# Altium schematic symbol library jlcpcb_2025_04_capacitors_extended_0805.schlib: 3281 symbols (part 18 of 18) (continued)
## TCC0805X7R475K100FT
designator C?  Capacitance: 4.7uF  (hidden comment: *)
Capacitor, Ceramic (MLCC), 4.7uF, ±10%, 10V, X7R, ±10%, SMD 0805; Manufacturer: CCTC; Manufacturer Part Number: TCC0805X7R475K100FT; Package Size: 0805; JLCPCB Basic Part: No; JLCPCB Part Number: C380350; Supplier 1: LCSC; Category: Capacitors - MLCC; Supplier Part Number 1: C380350; Tolerance: ±10%; Voltage Rating: 10V; Temperature Coefficient: X7R; RoHS: Yes; ComponentLink1Description: Datasheet; ComponentLink1URL: https://wmsc.lcsc.com/wmsc/upload/file/pdf/v2/lcsc/2304140030_CCTC-TCC0805X7R475K100FT_C380350.pdf; ComponentLink2Description: JLCPCB Part URL; ComponentLink2URL: https://jlcpcb.com/partdetail/C380350; ComponentLink3Description: LCSC Part URL; ComponentLink3URL: https://lcsc.com/product-detail/Multilayer-Ceramic-Capacitors-MLCC---SMD-SMT_CCTC-CCTC-TCC0805X7R475K100FT_C380350.html
footprint CAP-0805 (0805 (2012M) Capacitor)
pins: 1, 2

## TCC0805X7R475K250FT
designator C?  Capacitance: 4.7uF  (hidden comment: *)
Capacitor, Ceramic (MLCC), 4.7uF, ±10%, 25V, X7R, ±10%, SMD 0805; Manufacturer: CCTC; Manufacturer Part Number: TCC0805X7R475K250FT; Package Size: 0805; JLCPCB Basic Part: No; JLCPCB Part Number: C380351; Supplier 1: LCSC; Category: Capacitors - MLCC; Supplier Part Number 1: C380351; Tolerance: ±10%; Voltage Rating: 25V; Temperature Coefficient: X7R; RoHS: Yes; ComponentLink1Description: Datasheet; ComponentLink1URL: https://wmsc.lcsc.com/wmsc/upload/file/pdf/v2/lcsc/2304140030_CCTC-TCC0805X7R475K250FT_C380351.pdf; ComponentLink2Description: JLCPCB Part URL; ComponentLink2URL: https://jlcpcb.com/partdetail/C380351; ComponentLink3Description: LCSC Part URL; ComponentLink3URL: https://lcsc.com/product-detail/Multilayer-Ceramic-Capacitors-MLCC---SMD-SMT_CCTC-CCTC-TCC0805X7R475K250FT_C380351.html
footprint CAP-0805 (0805 (2012M) Capacitor)
pins: 1, 2

## TCC0805X7R502K500DT
designator C?  Capacitance: 5nF  (hidden comment: *)
Capacitor, Ceramic (MLCC), 5nF, ±10%, 50V, X7R, ±10%, SMD 0805; Manufacturer: CCTC; Manufacturer Part Number: TCC0805X7R502K500DT; Package Size: 0805; JLCPCB Basic Part: No; JLCPCB Part Number: C376995; Supplier 1: LCSC; Category: Capacitors - MLCC; Supplier Part Number 1: C376995; Tolerance: ±10%; Voltage Rating: 50V; Temperature Coefficient: X7R; RoHS: Yes; ComponentLink1Description: Datasheet; ComponentLink1URL: https://wmsc.lcsc.com/wmsc/upload/file/pdf/v2/lcsc/2304140030_CCTC-TCC0805X7R502K500DT_C376995.pdf; ComponentLink2Description: JLCPCB Part URL; ComponentLink2URL: https://jlcpcb.com/partdetail/C376995; ComponentLink3Description: LCSC Part URL; ComponentLink3URL: https://lcsc.com/product-detail/Multilayer-Ceramic-Capacitors-MLCC---SMD-SMT_CCTC-CCTC-TCC0805X7R502K500DT_C376995.html
footprint CAP-0805 (0805 (2012M) Capacitor)
pins: 1, 2

## TCC0805X7R561K500BT
designator C?  Capacitance: 560pF  (hidden comment: *)
Capacitor, Ceramic (MLCC), 560pF, ±10%, 50V, X7R, ±10%, SMD 0805; Manufacturer: CCTC; Manufacturer Part Number: TCC0805X7R561K500BT; Package Size: 0805; JLCPCB Basic Part: No; JLCPCB Part Number: C282771; Supplier 1: LCSC; Category: Capacitors - MLCC; Supplier Part Number 1: C282771; Tolerance: ±10%; Voltage Rating: 50V; Temperature Coefficient: X7R; RoHS: Yes; ComponentLink1Description: Datasheet; ComponentLink1URL: https://wmsc.lcsc.com/wmsc/upload/file/pdf/v2/lcsc/2304140030_CCTC-TCC0805X7R561K500BT_C282771.pdf; ComponentLink2Description: JLCPCB Part URL; ComponentLink2URL: https://jlcpcb.com/partdetail/C282771; ComponentLink3Description: LCSC Part URL; ComponentLink3URL: https://lcsc.com/product-detail/Multilayer-Ceramic-Capacitors-MLCC---SMD-SMT_CCTC-CCTC-TCC0805X7R561K500BT_C282771.html
footprint CAP-0805 (0805 (2012M) Capacitor)
pins: 1, 2

## TCC0805X7R561K500DTS
designator C?  Capacitance: 560pF  (hidden comment: *)
Capacitor, Ceramic (MLCC), 560pF, ±10%, 50V, X7R, ±10%, SMD 0805; Manufacturer: CCTC; Manufacturer Part Number: TCC0805X7R561K500DTS; Package Size: 0805; JLCPCB Basic Part: No; JLCPCB Part Number: C376999; Supplier 1: LCSC; Category: Capacitors - MLCC; Supplier Part Number 1: C376999; Tolerance: ±10%; Voltage Rating: 50V; Temperature Coefficient: X7R; RoHS: Yes; ComponentLink1Description: Datasheet; ComponentLink1URL: https://wmsc.lcsc.com/wmsc/upload/file/pdf/v2/lcsc/2304140030_CCTC-TCC0805X7R561K500DTS_C376999.pdf; ComponentLink2Description: JLCPCB Part URL; ComponentLink2URL: https://jlcpcb.com/partdetail/C376999; ComponentLink3Description: LCSC Part URL; ComponentLink3URL: https://lcsc.com/product-detail/Multilayer-Ceramic-Capacitors-MLCC---SMD-SMT_CCTC-CCTC-TCC0805X7R561K500DTS_C376999.html
footprint CAP-0805 (0805 (2012M) Capacitor)
pins: 1, 2

## TCC0805X7R562K500DT
designator C?  Capacitance: 5.6nF  (hidden comment: *)
Capacitor, Ceramic (MLCC), 5.6nF, ±10%, 50V, X7R, ±10%, SMD 0805; Manufacturer: CCTC; Manufacturer Part Number: TCC0805X7R562K500DT; Package Size: 0805; JLCPCB Basic Part: No; JLCPCB Part Number: C282772; Supplier 1: LCSC; Category: Capacitors - MLCC; Supplier Part Number 1: C282772; Tolerance: ±10%; Voltage Rating: 50V; Temperature Coefficient: X7R; RoHS: Yes; ComponentLink1Description: Datasheet; ComponentLink1URL: https://wmsc.lcsc.com/wmsc/upload/file/pdf/v2/lcsc/2304140030_CCTC-TCC0805X7R562K500DT_C282772.pdf; ComponentLink2Description: JLCPCB Part URL; ComponentLink2URL: https://jlcpcb.com/partdetail/C282772; ComponentLink3Description: LCSC Part URL; ComponentLink3URL: https://lcsc.com/product-detail/Multilayer-Ceramic-Capacitors-MLCC---SMD-SMT_CCTC-CCTC-TCC0805X7R562K500DT_C282772.html
footprint CAP-0805 (0805 (2012M) Capacitor)
pins: 1, 2

## TCC0805X7R563K500DT
designator C?  Capacitance: 56nF  (hidden comment: *)
Capacitor, Ceramic (MLCC), 56nF, ±10%, 50V, X7R, ±10%, SMD 0805; Manufacturer: CCTC; Manufacturer Part Number: TCC0805X7R563K500DT; Package Size: 0805; JLCPCB Basic Part: No; JLCPCB Part Number: C282773; Supplier 1: LCSC; Category: Capacitors - MLCC; Supplier Part Number 1: C282773; Tolerance: ±10%; Voltage Rating: 50V; Temperature Coefficient: X7R; RoHS: Yes; ComponentLink1Description: Datasheet; ComponentLink1URL: https://wmsc.lcsc.com/wmsc/upload/file/pdf/v2/lcsc/2304140030_CCTC-TCC0805X7R563K500DT_C282773.pdf; ComponentLink2Description: JLCPCB Part URL; ComponentLink2URL: https://jlcpcb.com/partdetail/C282773; ComponentLink3Description: LCSC Part URL; ComponentLink3URL: https://lcsc.com/product-detail/Multilayer-Ceramic-Capacitors-MLCC---SMD-SMT_CCTC-CCTC-TCC0805X7R563K500DT_C282773.html
footprint CAP-0805 (0805 (2012M) Capacitor)
pins: 1, 2

## TCC0805X7R564K500DT
designator C?  Capacitance: 560nF  (hidden comment: *)
Capacitor, Ceramic (MLCC), 560nF, ±10%, 50V, X7R, ±10%, SMD 0805; Manufacturer: CCTC; Manufacturer Part Number: TCC0805X7R564K500DT; Package Size: 0805; JLCPCB Basic Part: No; JLCPCB Part Number: C377000; Supplier 1: LCSC; Category: Capacitors - MLCC; Supplier Part Number 1: C377000; Tolerance: ±10%; Voltage Rating: 50V; Temperature Coefficient: X7R; RoHS: Yes; ComponentLink1Description: Datasheet; ComponentLink1URL: https://wmsc.lcsc.com/wmsc/upload/file/pdf/v2/lcsc/2304140030_CCTC-TCC0805X7R564K500DT_C377000.pdf; ComponentLink2Description: JLCPCB Part URL; ComponentLink2URL: https://jlcpcb.com/partdetail/C377000; ComponentLink3Description: LCSC Part URL; ComponentLink3URL: https://lcsc.com/product-detail/Multilayer-Ceramic-Capacitors-MLCC---SMD-SMT_CCTC-CCTC-TCC0805X7R564K500DT_C377000.html
footprint CAP-0805 (0805 (2012M) Capacitor)
pins: 1, 2

## TCC0805X7R564M500DT
designator C?  Capacitance: 560000pF  (hidden comment: *)
Capacitor, Ceramic (MLCC), 560000pF, ±20%, null, X7R, ±20%, SMD 0805; Manufacturer: CCTC; Manufacturer Part Number: TCC0805X7R564M500DT; Package Size: 0805; JLCPCB Basic Part: No; JLCPCB Part Number: C7393963; Supplier 1: LCSC; Category: Capacitors - MLCC; Supplier Part Number 1: C7393963; Tolerance: ±20%; Voltage Rating: null; Temperature Coefficient: X7R; RoHS: Yes; ComponentLink1Description: Datasheet; ComponentLink1URL: https://wmsc.lcsc.com/wmsc/upload/file/pdf/v2/lcsc/2306211555_CCTC-TCC0805X7R564M500DT_C7393963.pdf; ComponentLink2Description: JLCPCB Part URL; ComponentLink2URL: https://jlcpcb.com/partdetail/C7393963; ComponentLink3Description: LCSC Part URL; ComponentLink3URL: https://lcsc.com/product-detail/Multilayer-Ceramic-Capacitors-MLCC---SMD-SMT_CCTC-CCTC-TCC0805X7R564M500DT_C7393963.html
footprint CAP-0805 (0805 (2012M) Capacitor)
pins: 1, 2

## TCC0805X7R681K101DT
designator C?  Capacitance: 680pF  (hidden comment: *)
Capacitor, Ceramic (MLCC), 680pF, ±10%, 100V, X7R, ±10%, SMD 0805; Manufacturer: CCTC; Manufacturer Part Number: TCC0805X7R681K101DT; Package Size: 0805; JLCPCB Basic Part: No; JLCPCB Part Number: C282774; Supplier 1: LCSC; Category: Capacitors - MLCC; Supplier Part Number 1: C282774; Tolerance: ±10%; Voltage Rating: 100V; Temperature Coefficient: X7R; RoHS: Yes; ComponentLink1Description: Datasheet; ComponentLink1URL: https://wmsc.lcsc.com/wmsc/upload/file/pdf/v2/lcsc/2304140030_CCTC-TCC0805X7R681K101DT_C282774.pdf; ComponentLink2Description: JLCPCB Part URL; ComponentLink2URL: https://jlcpcb.com/partdetail/C282774; ComponentLink3Description: LCSC Part URL; ComponentLink3URL: https://lcsc.com/product-detail/Multilayer-Ceramic-Capacitors-MLCC---SMD-SMT_CCTC-CCTC-TCC0805X7R681K101DT_C282774.html
footprint CAP-0805 (0805 (2012M) Capacitor)
pins: 1, 2

## TCC0805X7R681K251DT
designator C?  Capacitance: 680pF  (hidden comment: *)
Capacitor, Ceramic (MLCC), 680pF, ±10%, 250V, X7R, ±10%, SMD 0805; Manufacturer: CCTC; Manufacturer Part Number: TCC0805X7R681K251DT; Package Size: 0805; JLCPCB Basic Part: No; JLCPCB Part Number: C377002; Supplier 1: LCSC; Category: Capacitors - MLCC; Supplier Part Number 1: C377002; Tolerance: ±10%; Voltage Rating: 250V; Temperature Coefficient: X7R; RoHS: Yes; ComponentLink1Description: Datasheet; ComponentLink1URL: https://wmsc.lcsc.com/wmsc/upload/file/pdf/v2/lcsc/2304140030_CCTC-TCC0805X7R681K251DT_C377002.pdf; ComponentLink2Description: JLCPCB Part URL; ComponentLink2URL: https://jlcpcb.com/partdetail/C377002; ComponentLink3Description: LCSC Part URL; ComponentLink3URL: https://lcsc.com/product-detail/Multilayer-Ceramic-Capacitors-MLCC---SMD-SMT_CCTC-CCTC-TCC0805X7R681K251DT_C377002.html
footprint CAP-0805 (0805 (2012M) Capacitor)
pins: 1, 2

## TCC0805X7R681K500DT
designator C?  Capacitance: 680pF  (hidden comment: *)
Capacitor, Ceramic (MLCC), 680pF, ±10%, 50V, X7R, ±10%, SMD 0805; Manufacturer: CCTC; Manufacturer Part Number: TCC0805X7R681K500DT; Package Size: 0805; JLCPCB Basic Part: No; JLCPCB Part Number: C282775; Supplier 1: LCSC; Category: Capacitors - MLCC; Supplier Part Number 1: C282775; Tolerance: ±10%; Voltage Rating: 50V; Temperature Coefficient: X7R; RoHS: Yes; ComponentLink1Description: Datasheet; ComponentLink1URL: https://wmsc.lcsc.com/wmsc/upload/file/pdf/v2/lcsc/2304140030_CCTC-TCC0805X7R681K500DT_C282775.pdf; ComponentLink2Description: JLCPCB Part URL; ComponentLink2URL: https://jlcpcb.com/partdetail/C282775; ComponentLink3Description: LCSC Part URL; ComponentLink3URL: https://lcsc.com/product-detail/Multilayer-Ceramic-Capacitors-MLCC---SMD-SMT_CCTC-CCTC-TCC0805X7R681K500DT_C282775.html
footprint CAP-0805 (0805 (2012M) Capacitor)
pins: 1, 2

## TCC0805X7R681K501DT
designator C?  Capacitance: 680pF  (hidden comment: *)
Capacitor, Ceramic (MLCC), 680pF, ±10%, 500V, X7R, ±10%, SMD 0805; Manufacturer: CCTC; Manufacturer Part Number: TCC0805X7R681K501DT; Package Size: 0805; JLCPCB Basic Part: No; JLCPCB Part Number: C880653; Supplier 1: LCSC; Category: Capacitors - MLCC; Supplier Part Number 1: C880653; Tolerance: ±10%; Voltage Rating: 500V; Temperature Coefficient: X7R; RoHS: Yes; ComponentLink1Description: Datasheet; ComponentLink1URL: https://wmsc.lcsc.com/wmsc/upload/file/pdf/v2/lcsc/2304140030_CCTC-TCC0805X7R681K501DT_C880653.pdf; ComponentLink2Description: JLCPCB Part URL; ComponentLink2URL: https://jlcpcb.com/partdetail/C880653; ComponentLink3Description: LCSC Part URL; ComponentLink3URL: https://lcsc.com/product-detail/Multilayer-Ceramic-Capacitors-MLCC---SMD-SMT_CCTC-CCTC-TCC0805X7R681K501DT_C880653.html
footprint CAP-0805 (0805 (2012M) Capacitor)
pins: 1, 2

## TCC0805X7R682K101DT
designator C?  Capacitance: 6.8nF  (hidden comment: *)
Capacitor, Ceramic (MLCC), 6.8nF, ±10%, 100V, X7R, ±10%, SMD 0805; Manufacturer: CCTC; Manufacturer Part Number: TCC0805X7R682K101DT; Package Size: 0805; JLCPCB Basic Part: No; JLCPCB Part Number: C282776; Supplier 1: LCSC; Category: Capacitors - MLCC; Supplier Part Number 1: C282776; Tolerance: ±10%; Voltage Rating: 100V; Temperature Coefficient: X7R; RoHS: Yes; ComponentLink1Description: Datasheet; ComponentLink1URL: https://wmsc.lcsc.com/wmsc/upload/file/pdf/v2/lcsc/2304140030_CCTC-TCC0805X7R682K101DT_C282776.pdf; ComponentLink2Description: JLCPCB Part URL; ComponentLink2URL: https://jlcpcb.com/partdetail/C282776; ComponentLink3Description: LCSC Part URL; ComponentLink3URL: https://lcsc.com/product-detail/Multilayer-Ceramic-Capacitors-MLCC---SMD-SMT_CCTC-CCTC-TCC0805X7R682K101DT_C282776.html
footprint CAP-0805 (0805 (2012M) Capacitor)
pins: 1, 2

## TCC0805X7R682K251DT
designator C?  Capacitance: 6.8nF  (hidden comment: *)
Capacitor, Ceramic (MLCC), 6.8nF, ±10%, 250V, X7R, ±10%, SMD 0805; Manufacturer: CCTC; Manufacturer Part Number: TCC0805X7R682K251DT; Package Size: 0805; JLCPCB Basic Part: No; JLCPCB Part Number: C282777; Supplier 1: LCSC; Category: Capacitors - MLCC; Supplier Part Number 1: C282777; Tolerance: ±10%; Voltage Rating: 250V; Temperature Coefficient: X7R; RoHS: Yes; ComponentLink1Description: Datasheet; ComponentLink1URL: https://wmsc.lcsc.com/wmsc/upload/file/pdf/v2/lcsc/2304140030_CCTC-TCC0805X7R682K251DT_C282777.pdf; ComponentLink2Description: JLCPCB Part URL; ComponentLink2URL: https://jlcpcb.com/partdetail/C282777; ComponentLink3Description: LCSC Part URL; ComponentLink3URL: https://lcsc.com/product-detail/Multilayer-Ceramic-Capacitors-MLCC---SMD-SMT_CCTC-CCTC-TCC0805X7R682K251DT_C282777.html
footprint CAP-0805 (0805 (2012M) Capacitor)
pins: 1, 2

## TCC0805X7R682K500DT
designator C?  Capacitance: 6.8nF  (hidden comment: *)
Capacitor, Ceramic (MLCC), 6.8nF, ±10%, 50V, X7R, ±10%, SMD 0805; Manufacturer: CCTC; Manufacturer Part Number: TCC0805X7R682K500DT; Package Size: 0805; JLCPCB Basic Part: No; JLCPCB Part Number: C282778; Supplier 1: LCSC; Category: Capacitors - MLCC; Supplier Part Number 1: C282778; Tolerance: ±10%; Voltage Rating: 50V; Temperature Coefficient: X7R; RoHS: Yes; ComponentLink1Description: Datasheet; ComponentLink1URL: https://wmsc.lcsc.com/wmsc/upload/file/pdf/v2/lcsc/2304140030_CCTC-TCC0805X7R682K500DT_C282778.pdf; ComponentLink2Description: JLCPCB Part URL; ComponentLink2URL: https://jlcpcb.com/partdetail/C282778; ComponentLink3Description: LCSC Part URL; ComponentLink3URL: https://lcsc.com/product-detail/Multilayer-Ceramic-Capacitors-MLCC---SMD-SMT_CCTC-CCTC-TCC0805X7R682K500DT_C282778.html
footprint CAP-0805 (0805 (2012M) Capacitor)
pins: 1, 2

## TCC0805X7R682K500DTS
designator C?  Capacitance: 6.8nF  (hidden comment: *)
Capacitor, Ceramic (MLCC), 6.8nF, ±10%, 50V, X7R, ±10%, SMD 0805; Manufacturer: CCTC; Manufacturer Part Number: TCC0805X7R682K500DTS; Package Size: 0805; JLCPCB Basic Part: No; JLCPCB Part Number: C377004; Supplier 1: LCSC; Category: Capacitors - MLCC; Supplier Part Number 1: C377004; Tolerance: ±10%; Voltage Rating: 50V; Temperature Coefficient: X7R; RoHS: Yes; ComponentLink1Description: Datasheet; ComponentLink1URL: https://wmsc.lcsc.com/wmsc/upload/file/pdf/v2/lcsc/2304140030_CCTC-TCC0805X7R682K500DTS_C377004.pdf; ComponentLink2Description: JLCPCB Part URL; ComponentLink2URL: https://jlcpcb.com/partdetail/C377004; ComponentLink3Description: LCSC Part URL; ComponentLink3URL: https://lcsc.com/product-detail/Multilayer-Ceramic-Capacitors-MLCC---SMD-SMT_CCTC-CCTC-TCC0805X7R682K500DTS_C377004.html
footprint CAP-0805 (0805 (2012M) Capacitor)
pins: 1, 2

## TCC0805X7R683K500DT
designator C?  Capacitance: 68nF  (hidden comment: *)
Capacitor, Ceramic (MLCC), 68nF, ±10%, 50V, X7R, ±10%, SMD 0805; Manufacturer: CCTC; Manufacturer Part Number: TCC0805X7R683K500DT; Package Size: 0805; JLCPCB Basic Part: No; JLCPCB Part Number: C282779; Supplier 1: LCSC; Category: Capacitors - MLCC; Supplier Part Number 1: C282779; Tolerance: ±10%; Voltage Rating: 50V; Temperature Coefficient: X7R; RoHS: Yes; ComponentLink1Description: Datasheet; ComponentLink1URL: https://wmsc.lcsc.com/wmsc/upload/file/pdf/v2/lcsc/2304140030_CCTC-TCC0805X7R683K500DT_C282779.pdf; ComponentLink2Description: JLCPCB Part URL; ComponentLink2URL: https://jlcpcb.com/partdetail/C282779; ComponentLink3Description: LCSC Part URL; ComponentLink3URL: https://lcsc.com/product-detail/Multilayer-Ceramic-Capacitors-MLCC---SMD-SMT_CCTC-CCTC-TCC0805X7R683K500DT_C282779.html
footprint CAP-0805 (0805 (2012M) Capacitor)
pins: 1, 2

## TCC0805X7R684K500DT
designator C?  Capacitance: 680nF  (hidden comment: *)
Capacitor, Ceramic (MLCC), 680nF, ±10%, 50V, X7R, ±10%, SMD 0805; Manufacturer: CCTC; Manufacturer Part Number: TCC0805X7R684K500DT; Package Size: 0805; JLCPCB Basic Part: No; JLCPCB Part Number: C282780; Supplier 1: LCSC; Category: Capacitors - MLCC; Supplier Part Number 1: C282780; Tolerance: ±10%; Voltage Rating: 50V; Temperature Coefficient: X7R; RoHS: Yes; ComponentLink1Description: Datasheet; ComponentLink1URL: https://wmsc.lcsc.com/wmsc/upload/file/pdf/v2/lcsc/2304140030_CCTC-TCC0805X7R684K500DT_C282780.pdf; ComponentLink2Description: JLCPCB Part URL; ComponentLink2URL: https://jlcpcb.com/partdetail/C282780; ComponentLink3Description: LCSC Part URL; ComponentLink3URL: https://lcsc.com/product-detail/Multilayer-Ceramic-Capacitors-MLCC---SMD-SMT_CCTC-CCTC-TCC0805X7R684K500DT_C282780.html
footprint CAP-0805 (0805 (2012M) Capacitor)
pins: 1, 2

## TCC0805X7R684K500FT
designator C?  Capacitance: 680nF  (hidden comment: *)
Capacitor, Ceramic (MLCC), 680nF, ±10%, 50V, X7R, ±10%, SMD 0805; Manufacturer: CCTC; Manufacturer Part Number: TCC0805X7R684K500FT; Package Size: 0805; JLCPCB Basic Part: No; JLCPCB Part Number: C374075; Supplier 1: LCSC; Category: Capacitors - MLCC; Supplier Part Number 1: C374075; Tolerance: ±10%; Voltage Rating: 50V; Temperature Coefficient: X7R; RoHS: Yes; ComponentLink1Description: Datasheet; ComponentLink1URL: https://wmsc.lcsc.com/wmsc/upload/file/pdf/v2/lcsc/2304140030_CCTC-TCC0805X7R684K500FT_C374075.pdf; ComponentLink2Description: JLCPCB Part URL; ComponentLink2URL: https://jlcpcb.com/partdetail/C374075; ComponentLink3Description: LCSC Part URL; ComponentLink3URL: https://lcsc.com/product-detail/Multilayer-Ceramic-Capacitors-MLCC---SMD-SMT_CCTC-CCTC-TCC0805X7R684K500FT_C374075.html
footprint CAP-0805 (0805 (2012M) Capacitor)
pins: 1, 2

## TCC0805X7R821K500DT
designator C?  Capacitance: 820pF  (hidden comment: *)
Capacitor, Ceramic (MLCC), 820pF, ±10%, 50V, X7R, ±10%, SMD 0805; Manufacturer: CCTC; Manufacturer Part Number: TCC0805X7R821K500DT; Package Size: 0805; JLCPCB Basic Part: No; JLCPCB Part Number: C377006; Supplier 1: LCSC; Category: Capacitors - MLCC; Supplier Part Number 1: C377006; Tolerance: ±10%; Voltage Rating: 50V; Temperature Coefficient: X7R; RoHS: Yes; ComponentLink1Description: Datasheet; ComponentLink1URL: https://wmsc.lcsc.com/wmsc/upload/file/pdf/v2/lcsc/2304140030_CCTC-TCC0805X7R821K500DT_C377006.pdf; ComponentLink2Description: JLCPCB Part URL; ComponentLink2URL: https://jlcpcb.com/partdetail/C377006; ComponentLink3Description: LCSC Part URL; ComponentLink3URL: https://lcsc.com/product-detail/Multilayer-Ceramic-Capacitors-MLCC---SMD-SMT_CCTC-CCTC-TCC0805X7R821K500DT_C377006.html
footprint CAP-0805 (0805 (2012M) Capacitor)
pins: 1, 2

## TCC0805X7R822K500DT
designator C?  Capacitance: 8.2nF  (hidden comment: *)
Capacitor, Ceramic (MLCC), 8.2nF, ±10%, 50V, X7R, ±10%, SMD 0805; Manufacturer: CCTC; Manufacturer Part Number: TCC0805X7R822K500DT; Package Size: 0805; JLCPCB Basic Part: No; JLCPCB Part Number: C377008; Supplier 1: LCSC; Category: Capacitors - MLCC; Supplier Part Number 1: C377008; Tolerance: ±10%; Voltage Rating: 50V; Temperature Coefficient: X7R; RoHS: Yes; ComponentLink1Description: Datasheet; ComponentLink1URL: https://wmsc.lcsc.com/wmsc/upload/file/pdf/v2/lcsc/2304140030_CCTC-TCC0805X7R822K500DT_C377008.pdf; ComponentLink2Description: JLCPCB Part URL; ComponentLink2URL: https://jlcpcb.com/partdetail/C377008; ComponentLink3Description: LCSC Part URL; ComponentLink3URL: https://lcsc.com/product-detail/Multilayer-Ceramic-Capacitors-MLCC---SMD-SMT_CCTC-CCTC-TCC0805X7R822K500DT_C377008.html
footprint CAP-0805 (0805 (2012M) Capacitor)
pins: 1, 2

## TCC0805X7R823K500DT
designator C?  Capacitance: 82nF  (hidden comment: *)
Capacitor, Ceramic (MLCC), 82nF, ±10%, 50V, X7R, ±10%, SMD 0805; Manufacturer: CCTC; Manufacturer Part Number: TCC0805X7R823K500DT; Package Size: 0805; JLCPCB Basic Part: No; JLCPCB Part Number: C377009; Supplier 1: LCSC; Category: Capacitors - MLCC; Supplier Part Number 1: C377009; Tolerance: ±10%; Voltage Rating: 50V; Temperature Coefficient: X7R; RoHS: Yes; ComponentLink1Description: Datasheet; ComponentLink1URL: https://wmsc.lcsc.com/wmsc/upload/file/pdf/v2/lcsc/2304140030_CCTC-TCC0805X7R823K500DT_C377009.pdf; ComponentLink2Description: JLCPCB Part URL; ComponentLink2URL: https://jlcpcb.com/partdetail/C377009; ComponentLink3Description: LCSC Part URL; ComponentLink3URL: https://lcsc.com/product-detail/Multilayer-Ceramic-Capacitors-MLCC---SMD-SMT_CCTC-CCTC-TCC0805X7R823K500DT_C377009.html
footprint CAP-0805 (0805 (2012M) Capacitor)
pins: 1, 2

## TCC0805Y5V105Z250FT
designator C?  Capacitance: 1uF  (hidden comment: *)
Capacitor, Ceramic (MLCC), 1uF, 25V, Y5V, SMD 0805; Manufacturer: CCTC; Manufacturer Part Number: TCC0805Y5V105Z250FT; Temperature Rating: -20%~+80%; Package Size: 0805; JLCPCB Basic Part: No; JLCPCB Part Number: C377010; Supplier 1: LCSC; Category: Capacitors - MLCC; Supplier Part Number 1: C377010; Voltage Rating: 25V; Temperature Coefficient: Y5V; RoHS: Yes; ComponentLink1Description: Datasheet; ComponentLink1URL: https://wmsc.lcsc.com/wmsc/upload/file/pdf/v2/lcsc/2304140030_CCTC-TCC0805Y5V105Z250FT_C377010.pdf; ComponentLink2Description: JLCPCB Part URL; ComponentLink2URL: https://jlcpcb.com/partdetail/C377010; ComponentLink3Description: LCSC Part URL; ComponentLink3URL: https://lcsc.com/product-detail/Multilayer-Ceramic-Capacitors-MLCC---SMD-SMT_CCTC-CCTC-TCC0805Y5V105Z250FT_C377010.html
footprint CAP-0805 (0805 (2012M) Capacitor)
pins: 1, 2

## TCC0805Y5V105Z500FT
designator C?  Capacitance: 1uF  (hidden comment: *)
Capacitor, Ceramic (MLCC), 1uF, 50V, Y5V, SMD 0805; Manufacturer: CCTC; Manufacturer Part Number: TCC0805Y5V105Z500FT; Temperature Rating: -20%~+80%; Package Size: 0805; JLCPCB Basic Part: No; JLCPCB Part Number: C377011; Supplier 1: LCSC; Category: Capacitors - MLCC; Supplier Part Number 1: C377011; Voltage Rating: 50V; Temperature Coefficient: Y5V; RoHS: Yes; ComponentLink1Description: Datasheet; ComponentLink1URL: https://wmsc.lcsc.com/wmsc/upload/file/pdf/v2/lcsc/2304140030_CCTC-TCC0805Y5V105Z500FT_C377011.pdf; ComponentLink2Description: JLCPCB Part URL; ComponentLink2URL: https://jlcpcb.com/partdetail/C377011; ComponentLink3Description: LCSC Part URL; ComponentLink3URL: https://lcsc.com/product-detail/Multilayer-Ceramic-Capacitors-MLCC---SMD-SMT_CCTC-CCTC-TCC0805Y5V105Z500FT_C377011.html
footprint CAP-0805 (0805 (2012M) Capacitor)
pins: 1, 2

## TCC0805Y5V474M500DT
designator C?  Capacitance: 470nF  (hidden comment: *)
Capacitor, Ceramic (MLCC), 470nF, ±20%, 50V, Y5V, ±20%, SMD 0805; Manufacturer: CCTC; Manufacturer Part Number: TCC0805Y5V474M500DT; Package Size: 0805; JLCPCB Basic Part: No; JLCPCB Part Number: C377012; Supplier 1: LCSC; Category: Capacitors - MLCC; Supplier Part Number 1: C377012; Tolerance: ±20%; Voltage Rating: 50V; Temperature Coefficient: Y5V; RoHS: Yes; ComponentLink1Description: Datasheet; ComponentLink1URL: https://wmsc.lcsc.com/wmsc/upload/file/pdf/v2/lcsc/2304140030_CCTC-TCC0805Y5V474M500DT_C377012.pdf; ComponentLink2Description: JLCPCB Part URL; ComponentLink2URL: https://jlcpcb.com/partdetail/C377012; ComponentLink3Description: LCSC Part URL; ComponentLink3URL: https://lcsc.com/product-detail/Multilayer-Ceramic-Capacitors-MLCC---SMD-SMT_CCTC-CCTC-TCC0805Y5V474M500DT_C377012.html
footprint CAP-0805 (0805 (2012M) Capacitor)
pins: 1, 2

## TMF212B7105KGHT
designator C?  Capacitance: 1uF  (hidden comment: *)
Capacitor, Ceramic (MLCC), 1uF, ±10%, 25V, X7R, ±10%, SMD 0805; Manufacturer: Taiyo Yuden; Manufacturer Part Number: TMF212B7105KGHT; Package Size: 0805; JLCPCB Basic Part: No; JLCPCB Part Number: C651005; Supplier 1: LCSC; Category: Capacitors - MLCC; Supplier Part Number 1: C651005; Tolerance: ±10%; Voltage Rating: 25V; Temperature Coefficient: X7R; RoHS: Yes; ComponentLink1Description: Datasheet; ComponentLink1URL: https://wmsc.lcsc.com/wmsc/upload/file/pdf/v2/lcsc/2304140030_Taiyo-Yuden-TMF212B7105KGHT_C651005.pdf; ComponentLink2Description: JLCPCB Part URL; ComponentLink2URL: https://jlcpcb.com/partdetail/C651005; ComponentLink3Description: LCSC Part URL; ComponentLink3URL: https://lcsc.com/product-detail/Multilayer-Ceramic-Capacitors-MLCC---SMD-SMT_Taiyo-Yuden-Taiyo-Yuden-TMF212B7105KGHT_C651005.html
footprint CAP-0805 (0805 (2012M) Capacitor)
pins: 1, 2

## TMF212B7474KGHT
designator C?  Capacitance: 470nF  (hidden comment: *)
Capacitor, Ceramic (MLCC), 470nF, ±10%, 25V, X7R, ±10%, SMD 0805; Manufacturer: Taiyo Yuden; Manufacturer Part Number: TMF212B7474KGHT; Package Size: 0805; JLCPCB Basic Part: No; JLCPCB Part Number: C651008; Supplier 1: LCSC; Category: Capacitors - MLCC; Supplier Part Number 1: C651008; Tolerance: ±10%; Voltage Rating: 25V; Temperature Coefficient: X7R; RoHS: Yes; ComponentLink1Description: Datasheet; ComponentLink1URL: https://wmsc.lcsc.com/wmsc/upload/file/pdf/v2/lcsc/2304140030_Taiyo-Yuden-TMF212B7474KGHT_C651008.pdf; ComponentLink2Description: JLCPCB Part URL; ComponentLink2URL: https://jlcpcb.com/partdetail/C651008; ComponentLink3Description: LCSC Part URL; ComponentLink3URL: https://lcsc.com/product-detail/Multilayer-Ceramic-Capacitors-MLCC---SMD-SMT_Taiyo-Yuden-Taiyo-Yuden-TMF212B7474KGHT_C651008.html
footprint CAP-0805 (0805 (2012M) Capacitor)
pins: 1, 2

## TMK212AB7475KG-T
designator C?  Capacitance: 4.7uF  (hidden comment: *)
Capacitor, Ceramic (MLCC), 4.7uF, ±10%, 25V, X7R, ±10%, SMD 0805; Manufacturer: Taiyo Yuden; Manufacturer Part Number: TMK212AB7475KG-T; Package Size: 0805; JLCPCB Basic Part: No; JLCPCB Part Number: C163186; Supplier 1: LCSC; Category: Capacitors - MLCC; Supplier Part Number 1: C163186; Tolerance: ±10%; Voltage Rating: 25V; Temperature Coefficient: X7R; RoHS: Yes; ComponentLink1Description: Datasheet; ComponentLink1URL: https://wmsc.lcsc.com/wmsc/upload/file/pdf/v2/lcsc/2211282300_Taiyo-Yuden-TMK212AB7475KG-T_C163186.pdf; ComponentLink2Description: JLCPCB Part URL; ComponentLink2URL: https://jlcpcb.com/partdetail/C163186; ComponentLink3Description: LCSC Part URL; ComponentLink3URL: https://lcsc.com/product-detail/Multilayer-Ceramic-Capacitors-MLCC---SMD-SMT_Taiyo-Yuden-Taiyo-Yuden-TMK212AB7475KG-T_C163186.html
footprint CAP-0805 (0805 (2012M) Capacitor)
pins: 1, 2

## TMK212AB7475MG-T
designator C?  Capacitance: 4.7uF  (hidden comment: *)
Capacitor, Ceramic (MLCC), 4.7uF, ±20%, 25V, X7R, ±20%, SMD 0805; Manufacturer: Taiyo Yuden; Manufacturer Part Number: TMK212AB7475MG-T; Package Size: 0805; JLCPCB Basic Part: No; JLCPCB Part Number: C337439; Supplier 1: LCSC; Category: Capacitors - MLCC; Supplier Part Number 1: C337439; Tolerance: ±20%; Voltage Rating: 25V; Temperature Coefficient: X7R; RoHS: Yes; ComponentLink1Description: Datasheet; ComponentLink1URL: https://wmsc.lcsc.com/wmsc/upload/file/pdf/v2/lcsc/2304140030_Taiyo-Yuden-TMK212AB7475MG-T_C337439.pdf; ComponentLink2Description: JLCPCB Part URL; ComponentLink2URL: https://jlcpcb.com/partdetail/C337439; ComponentLink3Description: LCSC Part URL; ComponentLink3URL: https://lcsc.com/product-detail/Multilayer-Ceramic-Capacitors-MLCC---SMD-SMT_Taiyo-Yuden-Taiyo-Yuden-TMK212AB7475MG-T_C337439.html
footprint CAP-0805 (0805 (2012M) Capacitor)
pins: 1, 2

## TMK212ABJ475KG-T
designator C?  Capacitance: 4.7uF  (hidden comment: *)
Capacitor, Ceramic (MLCC), 4.7uF, ±10%, 25V, X5R, ±10%, SMD 0805; Manufacturer: Taiyo Yuden; Manufacturer Part Number: TMK212ABJ475KG-T; Package Size: 0805; JLCPCB Basic Part: No; JLCPCB Part Number: C386082; Supplier 1: LCSC; Category: Capacitors - MLCC; Supplier Part Number 1: C386082; Tolerance: ±10%; Voltage Rating: 25V; Temperature Coefficient: X5R; RoHS: Yes; ComponentLink1Description: Datasheet; ComponentLink1URL: https://wmsc.lcsc.com/wmsc/upload/file/pdf/v2/lcsc/2304140030_Taiyo-Yuden-TMK212ABJ475KG-T_C386082.pdf; ComponentLink2Description: JLCPCB Part URL; ComponentLink2URL: https://jlcpcb.com/partdetail/C386082; ComponentLink3Description: LCSC Part URL; ComponentLink3URL: https://lcsc.com/product-detail/Multilayer-Ceramic-Capacitors-MLCC---SMD-SMT_Taiyo-Yuden-Taiyo-Yuden-TMK212ABJ475KG-T_C386082.html
footprint CAP-0805 (0805 (2012M) Capacitor)
pins: 1, 2

## TMK212B7105KG-T
designator C?  Capacitance: 1uF  (hidden comment: *)
Capacitor, Ceramic (MLCC), 1uF, ±10%, 25V, X7R, ±10%, SMD 0805; Manufacturer: Taiyo Yuden; Manufacturer Part Number: TMK212B7105KG-T; Package Size: 0805; JLCPCB Basic Part: No; JLCPCB Part Number: C87155; Supplier 1: LCSC; Category: Capacitors - MLCC; Supplier Part Number 1: C87155; Tolerance: ±10%; Voltage Rating: 25V; Temperature Coefficient: X7R; RoHS: Yes; ComponentLink1Description: Datasheet; ComponentLink1URL: https://wmsc.lcsc.com/wmsc/upload/file/pdf/v2/lcsc/2304140030_Taiyo-Yuden-TMK212B7105KG-T_C87155.pdf; ComponentLink2Description: JLCPCB Part URL; ComponentLink2URL: https://jlcpcb.com/partdetail/C87155; ComponentLink3Description: LCSC Part URL; ComponentLink3URL: https://lcsc.com/product-detail/Multilayer-Ceramic-Capacitors-MLCC---SMD-SMT_Taiyo-Yuden-Taiyo-Yuden-TMK212B7105KG-T_C87155.html
footprint CAP-0805 (0805 (2012M) Capacitor)
pins: 1, 2

## TMK212B7105KGHTR
designator C?  Capacitance: 1uF  (hidden comment: *)
Capacitor, Ceramic (MLCC), 1uF, ±10%, 25V, X7R, ±10%, SMD 0805; Manufacturer: Taiyo Yuden; Manufacturer Part Number: TMK212B7105KGHTR; Package Size: 0805; JLCPCB Basic Part: No; JLCPCB Part Number: C650975; Supplier 1: LCSC; Category: Capacitors - MLCC; Supplier Part Number 1: C650975; Tolerance: ±10%; Voltage Rating: 25V; Temperature Coefficient: X7R; RoHS: Yes; ComponentLink1Description: Datasheet; ComponentLink1URL: https://wmsc.lcsc.com/wmsc/upload/file/pdf/v2/lcsc/2304140030_Taiyo-Yuden-TMK212B7105KGHTR_C650975.pdf; ComponentLink2Description: JLCPCB Part URL; ComponentLink2URL: https://jlcpcb.com/partdetail/C650975; ComponentLink3Description: LCSC Part URL; ComponentLink3URL: https://lcsc.com/product-detail/Multilayer-Ceramic-Capacitors-MLCC---SMD-SMT_Taiyo-Yuden-Taiyo-Yuden-TMK212B7105KGHTR_C650975.html
footprint CAP-0805 (0805 (2012M) Capacitor)
pins: 1, 2

## TMK212B7225KG-TR
designator C?  Capacitance: 2.2uF  (hidden comment: *)
Capacitor, Ceramic (MLCC), 2.2uF, ±10%, 25V, X7R, ±10%, SMD 0805; Manufacturer: Taiyo Yuden; Manufacturer Part Number: TMK212B7225KG-TR; Package Size: 0805; JLCPCB Basic Part: No; JLCPCB Part Number: C107703; Supplier 1: LCSC; Category: Capacitors - MLCC; Supplier Part Number 1: C107703; Tolerance: ±10%; Voltage Rating: 25V; Temperature Coefficient: X7R; RoHS: Yes; ComponentLink1Description: Datasheet; ComponentLink1URL: https://wmsc.lcsc.com/wmsc/upload/file/pdf/v2/lcsc/2211282300_Taiyo-Yuden-TMK212B7225KG-TR_C107703.pdf; ComponentLink2Description: JLCPCB Part URL; ComponentLink2URL: https://jlcpcb.com/partdetail/C107703; ComponentLink3Description: LCSC Part URL; ComponentLink3URL: https://lcsc.com/product-detail/Multilayer-Ceramic-Capacitors-MLCC---SMD-SMT_Taiyo-Yuden-Taiyo-Yuden-TMK212B7225KG-TR_C107703.html
footprint CAP-0805 (0805 (2012M) Capacitor)
pins: 1, 2

## TMK212B7225KGHT
designator C?  Capacitance: 2.2uF  (hidden comment: *)
Capacitor, Ceramic (MLCC), 2.2uF, ±10%, 25V, X7R, ±10%, SMD 0805; Manufacturer: Taiyo Yuden; Manufacturer Part Number: TMK212B7225KGHT; Package Size: 0805; JLCPCB Basic Part: No; JLCPCB Part Number: C386083; Supplier 1: LCSC; Category: Capacitors - MLCC; Supplier Part Number 1: C386083; Tolerance: ±10%; Voltage Rating: 25V; Temperature Coefficient: X7R; RoHS: Yes; ComponentLink1Description: Datasheet; ComponentLink1URL: https://wmsc.lcsc.com/wmsc/upload/file/pdf/v2/lcsc/2211282230_Taiyo-Yuden-TMK212B7225KGHT_C386083.pdf; ComponentLink2Description: JLCPCB Part URL; ComponentLink2URL: https://jlcpcb.com/partdetail/C386083; ComponentLink3Description: LCSC Part URL; ComponentLink3URL: https://lcsc.com/product-detail/Multilayer-Ceramic-Capacitors-MLCC---SMD-SMT_Taiyo-Yuden-Taiyo-Yuden-TMK212B7225KGHT_C386083.html
footprint CAP-0805 (0805 (2012M) Capacitor)
pins: 1, 2

## TMK212B7334KGHT
designator C?  Capacitance: 330nF  (hidden comment: *)
Capacitor, Ceramic (MLCC), 330nF, ±10%, 25V, X7R, ±10%, SMD 0805; Manufacturer: Taiyo Yuden; Manufacturer Part Number: TMK212B7334KGHT; Package Size: 0805; JLCPCB Basic Part: No; JLCPCB Part Number: C650967; Supplier 1: LCSC; Category: Capacitors - MLCC; Supplier Part Number 1: C650967; Tolerance: ±10%; Voltage Rating: 25V; Temperature Coefficient: X7R; RoHS: Yes; ComponentLink1Description: Datasheet; ComponentLink1URL: https://wmsc.lcsc.com/wmsc/upload/file/pdf/v2/lcsc/2304140030_Taiyo-Yuden-TMK212B7334KGHT_C650967.pdf; ComponentLink2Description: JLCPCB Part URL; ComponentLink2URL: https://jlcpcb.com/partdetail/C650967; ComponentLink3Description: LCSC Part URL; ComponentLink3URL: https://lcsc.com/product-detail/Multilayer-Ceramic-Capacitors-MLCC---SMD-SMT_Taiyo-Yuden-Taiyo-Yuden-TMK212B7334KGHT_C650967.html
footprint CAP-0805 (0805 (2012M) Capacitor)
pins: 1, 2

## TMK212B7473KD-T
designator C?  Capacitance: 47nF  (hidden comment: *)
Capacitor, Ceramic (MLCC), 47nF, ±10%, 25V, X7R, ±10%, SMD 0805; Manufacturer: Taiyo Yuden; Manufacturer Part Number: TMK212B7473KD-T; Package Size: 0805; JLCPCB Basic Part: No; JLCPCB Part Number: C524978; Supplier 1: LCSC; Category: Capacitors - MLCC; Supplier Part Number 1: C524978; Tolerance: ±10%; Voltage Rating: 25V; Temperature Coefficient: X7R; RoHS: Yes; ComponentLink1Description: Datasheet; ComponentLink1URL: https://wmsc.lcsc.com/wmsc/upload/file/pdf/v2/lcsc/2211282200_Taiyo-Yuden-TMK212B7473KD-T_C524978.pdf; ComponentLink2Description: JLCPCB Part URL; ComponentLink2URL: https://jlcpcb.com/partdetail/C524978; ComponentLink3Description: LCSC Part URL; ComponentLink3URL: https://lcsc.com/product-detail/Multilayer-Ceramic-Capacitors-MLCC---SMD-SMT_Taiyo-Yuden-Taiyo-Yuden-TMK212B7473KD-T_C524978.html
footprint CAP-0805 (0805 (2012M) Capacitor)
pins: 1, 2

## TMK212B7474KGHT
designator C?  Capacitance: 470nF  (hidden comment: *)
Capacitor, Ceramic (MLCC), 470nF, ±10%, 25V, X7R, ±10%, SMD 0805; Manufacturer: Taiyo Yuden; Manufacturer Part Number: TMK212B7474KGHT; Package Size: 0805; JLCPCB Basic Part: No; JLCPCB Part Number: C650984; Supplier 1: LCSC; Category: Capacitors - MLCC; Supplier Part Number 1: C650984; Tolerance: ±10%; Voltage Rating: 25V; Temperature Coefficient: X7R; RoHS: Yes; ComponentLink1Description: Datasheet; ComponentLink1URL: https://wmsc.lcsc.com/wmsc/upload/file/pdf/v2/lcsc/2211282200_Taiyo-Yuden-TMK212B7474KGHT_C650984.pdf; ComponentLink2Description: JLCPCB Part URL; ComponentLink2URL: https://jlcpcb.com/partdetail/C650984; ComponentLink3Description: LCSC Part URL; ComponentLink3URL: https://lcsc.com/product-detail/Multilayer-Ceramic-Capacitors-MLCC---SMD-SMT_Taiyo-Yuden-Taiyo-Yuden-TMK212B7474KGHT_C650984.html
footprint CAP-0805 (0805 (2012M) Capacitor)
pins: 1, 2

## TMK212BBJ106KG-T
designator C?  Capacitance: 10uF  (hidden comment: *)
Capacitor, Ceramic (MLCC), 10uF, ±10%, 25V, X5R, ±10%, SMD 0805; Manufacturer: Taiyo Yuden; Manufacturer Part Number: TMK212BBJ106KG-T; Package Size: 0805; JLCPCB Basic Part: No; JLCPCB Part Number: C386085; Supplier 1: LCSC; Category: Capacitors - MLCC; Supplier Part Number 1: C386085; Tolerance: ±10%; Voltage Rating: 25V; Temperature Coefficient: X5R; RoHS: Yes; ComponentLink1Description: Datasheet; ComponentLink1URL: https://wmsc.lcsc.com/wmsc/upload/file/pdf/v2/lcsc/2211282230_Taiyo-Yuden-TMK212BBJ106KG-T_C386085.pdf; ComponentLink2Description: JLCPCB Part URL; ComponentLink2URL: https://jlcpcb.com/partdetail/C386085; ComponentLink3Description: LCSC Part URL; ComponentLink3URL: https://lcsc.com/product-detail/Multilayer-Ceramic-Capacitors-MLCC---SMD-SMT_Taiyo-Yuden-Taiyo-Yuden-TMK212BBJ106KG-T_C386085.html
footprint CAP-0805 (0805 (2012M) Capacitor)
pins: 1, 2

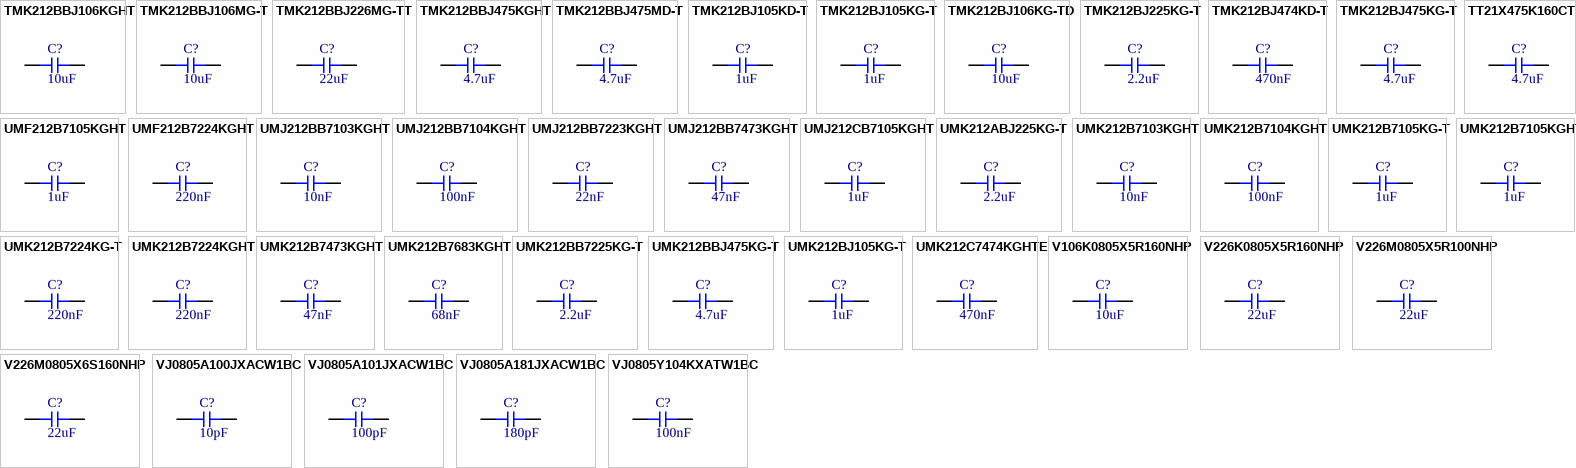
[diagram p81: symbols TMK212BBJ106KGHT to VJ0805Y104KXATW1BC]
